# Altium footprint library Connector-Header.PcbLib: 166 footprints (part 1 of 11)
Each footprint in its own frame and in the unit in brackets; x right, y up, seen from the top. Pads: shape width x height; smd on the part's side, far side on the other; paste and mask are expansions set on the pad; w line width, h text height; cw(c..) or ccw(c..) is an arc to the next point about the centre after c.
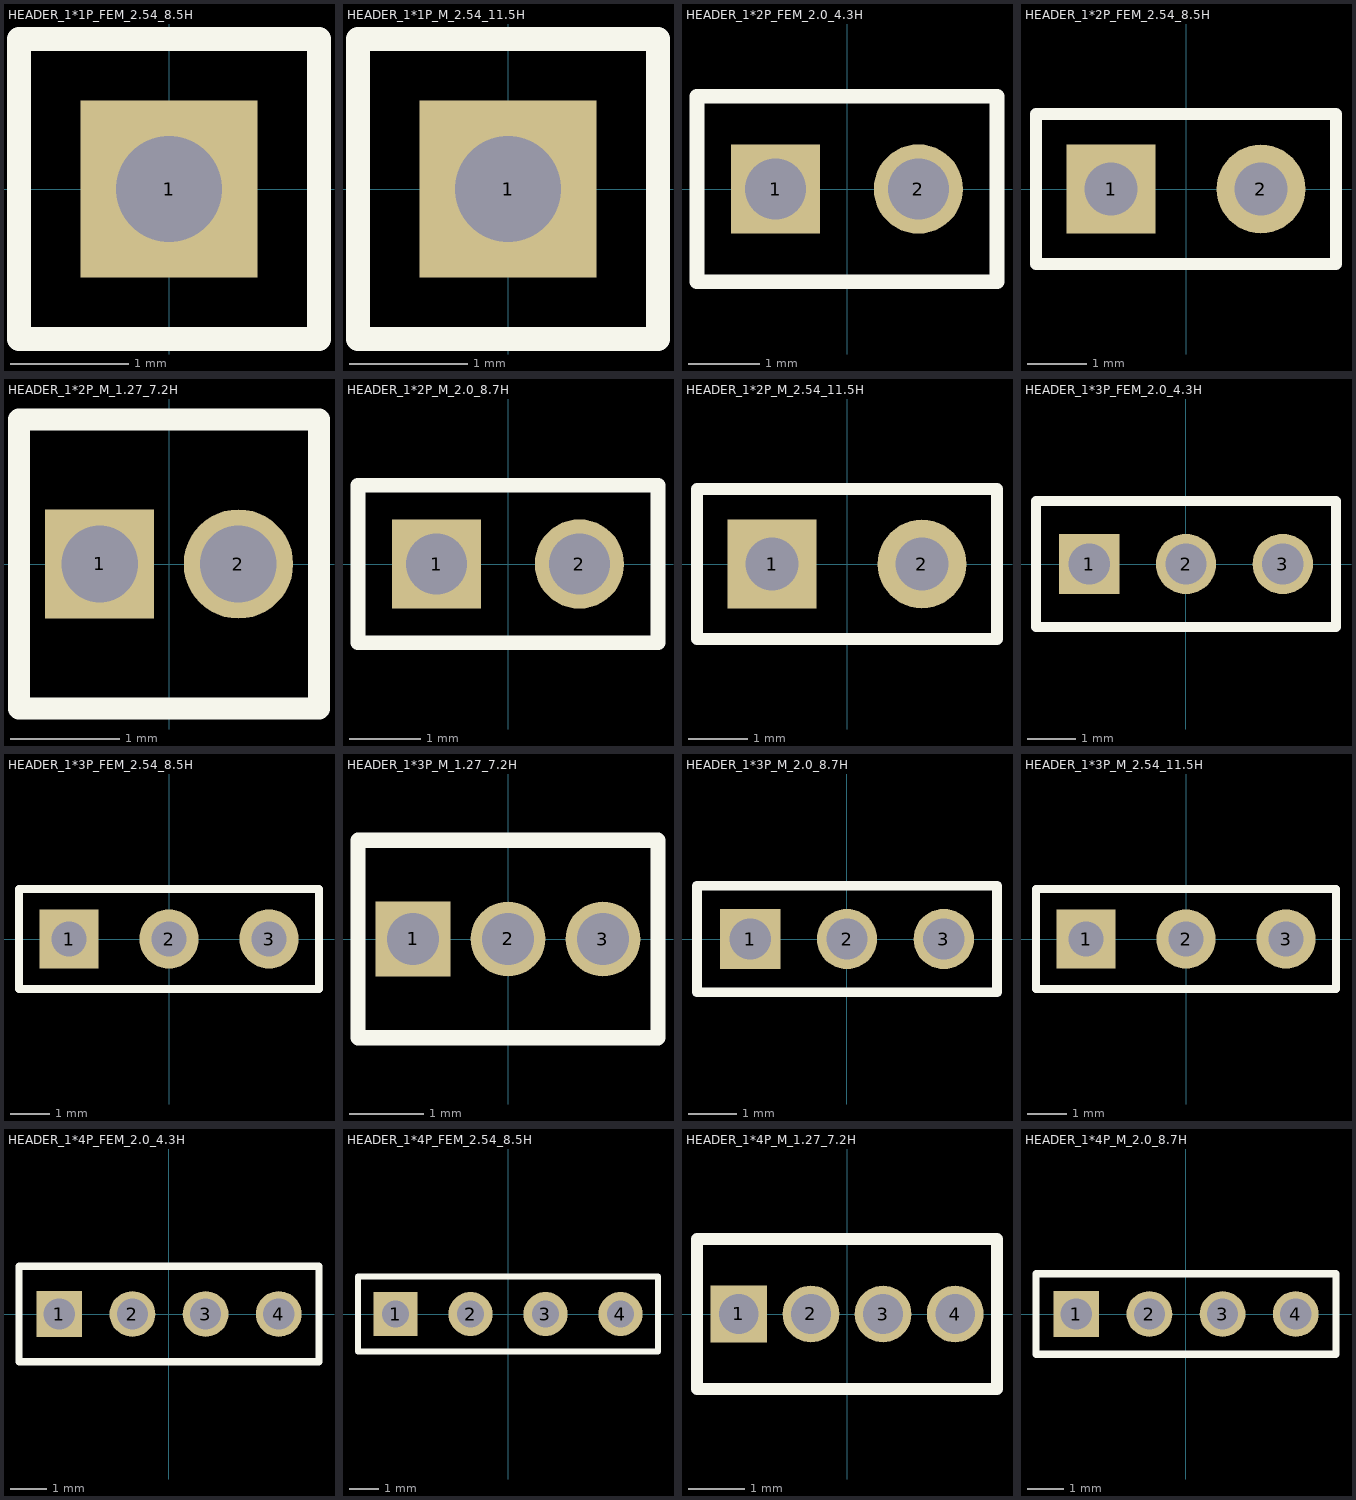
[diagram p0: the footprints below, top view; thin cyan lines are the x and y axes]

## HEADER_1*1P_FEM_2.54_8.5H [mm] "Connector; Header; 1 Position"
pads (1):
  rect 1.5x1.5 hole 0.9: 1(0,0)
Top Overlay:
  lines w0.2: -1.27,-1.27 -1.27,1.27 ; 1.27,-1.27 1.27,1.27
  lines w0.203: -1.27,-1.27 1.27,-1.27 ; -1.27,1.27 1.27,1.27
3D body "PinSocket_1x01_P2.54mm_Vertical.step": height 7, standoff -3.1, extent -1.27,-1.27 1.27,1.27

## HEADER_1*1P_M_2.54_11.5H [mm] "Connector; Header; 1 Position"
pads (1):
  rect 1.5x1.5 hole 0.9: 1(0,0)
Top Overlay:
  lines w0.2: -1.27,-1.27 -1.27,1.27 1.27,1.27 1.27,-1.27 -1.27,-1.27
3D body "PinHeader_1x01_P2.54mm_Vertical.step": height 8.54, standoff -3, extent -1.27,-1.27 1.27,1.27

## HEADER_1*2P_FEM_2.0_4.3H [mm]
pads (2):
  rect 1.25x1.25 hole 0.85: 1(-1,0)
  round 1.25 hole 0.85: 2(1,0)
Top Overlay:
  lines w0.203: -2.1,-1.3 2.1,-1.3 2.1,1.3 -2.1,1.3 -2.1,-1.3
3D body "PinSocket_1x02_P2.00mm_Vertical.step": height 5.6, standoff -2.7, extent -2,-1 2,1

## HEADER_1*2P_FEM_2.54_8.5H [mm] "Connector; Header; 2 Position"
pads (2):
  rect 1.5x1.5 hole 0.9: 1(-1.27,0)
  round 1.5 hole 0.9: 2(1.27,0)
Top Overlay:
  lines w0.2: -2.54,-1.27 -2.54,1.27 2.54,1.27 2.54,-1.27 -2.54,-1.27
3D body "PinSocket_1x02_P2.54mm_Vertical.step": height 7, standoff -3.1, extent -2.54,-1.27 2.54,1.27

## HEADER_1*2P_M_1.27_7.2H [mm]
pads (2):
  rect 1x1 hole 0.7: 1(-0.635,0)
  round 1 hole 0.7: 2(0.635,0)
Top Overlay:
  lines w0.203: -1.372,-1.321 -1.372,1.321 1.372,1.321 1.372,-1.321 -1.372,-1.321
3D body "PinHeader_1x02_P1.27mm_Vertical.step": height 4, standoff -2.3, extent -1.27,-1.05 1.27,1.05

## HEADER_1*2P_M_2.0_8.7H [mm]
pads (2):
  rect 1.25x1.25 hole 0.85: 1(-1,0)
  round 1.25 hole 0.85: 2(1,0)
Top Overlay:
  lines w0.203: -2.1,-1.1 2.1,-1.1 2.1,1.1 -2.1,1.1 -2.1,-1.1

## HEADER_1*2P_M_2.54_11.5H [mm] "Connector; Header; 2 Position"
pads (2):
  rect 1.5x1.5 hole 0.9: 1(-1.27,0)
  round 1.5 hole 0.9: 2(1.27,0)
Top Overlay:
  lines w0.2: -2.54,-1.27 -2.54,1.27 2.54,1.27 2.54,-1.27 -2.54,-1.27
3D body "PinHeader_1x02_P2.54mm_Vertical.step": height 8.54, standoff -3, extent -2.54,-1.27 2.54,1.27

## HEADER_1*3P_FEM_2.0_4.3H [mm]
pads (3):
  rect 1.25x1.25 hole 0.85: 1(-2,0)
  round 1.25 hole 0.85: 2(0,0) 3(2,0)
Top Overlay:
  lines w0.203: -3.1,-1.3 -3.1,1.3 3.1,1.3 3.1,-1.3 -3.1,-1.3

## HEADER_1*3P_FEM_2.54_8.5H [mm] "Connector; Header; 3 Position"
pads (3):
  rect 1.5x1.5 hole 0.9: 1(-2.54,0)
  round 1.5 hole 0.9: 2(0,0) 3(2.54,0)
Top Overlay:
  lines w0.2: -3.81,-1.27 3.81,-1.27 3.81,1.27 -3.81,1.27 -3.81,-1.27
3D body "PinSocket_1x03_P2.54mm_Vertical.step": height 7, standoff -3.1, extent -3.81,-1.27 3.81,1.27

## HEADER_1*3P_M_1.27_7.2H [mm]
pads (3):
  rect 1x1 hole 0.7: 1(-1.27,0)
  round 1 hole 0.7: 2(0,0) 3(1.27,0)
Top Overlay:
  lines w0.203: -2.007,-1.321 2.007,-1.321 2.007,1.321 -2.007,1.321 -2.007,-1.321

## HEADER_1*3P_M_2.0_8.7H [mm]
pads (3):
  rect 1.25x1.25 hole 0.85: 1(-2,0)
  round 1.25 hole 0.85: 2(0,0) 3(2,0)
Top Overlay:
  lines w0.203: -3.1,-1.1 3.1,-1.1 3.1,1.1 -3.1,1.1 -3.1,-1.1

## HEADER_1*3P_M_2.54_11.5H [mm] "Connector; Header; 3 Position"
pads (3):
  rect 1.5x1.5 hole 0.9: 1(-2.54,0)
  round 1.5 hole 0.9: 2(0,0) 3(2.54,0)
Top Overlay:
  lines w0.2: -3.81,-1.27 -3.81,1.27 3.81,1.27 3.81,-1.27 -3.81,-1.27
3D body "PinHeader_1x03_P2.54mm_Vertical.step": height 8.54, standoff -3, extent -3.81,-1.27 3.81,1.27

## HEADER_1*4P_FEM_2.0_4.3H [mm]
pads (4):
  rect 1.25x1.25 hole 0.85: 1(-3,0)
  round 1.25 hole 0.85: 2(-1,0) 3(1,0) 4(3,0)
Top Overlay:
  lines w0.203: -4.1,-1.3 -4.1,1.3 4.1,1.3 4.1,-1.3 -4.1,-1.3

## HEADER_1*4P_FEM_2.54_8.5H [mm]
pads (4):
  rect 1.5x1.5 hole 0.9: 1(-3.81,0)
  round 1.5 hole 0.9: 2(-1.27,0) 3(1.27,0) 4(3.81,0)
Top Overlay:
  lines w0.2: -5.08,-1.27 -5.08,1.27 5.08,1.27 5.08,-1.27 -5.08,-1.27
3D body "PinSocket_1x04_P2.54mm_Vertical.step": height 7, standoff -3.1, extent -5.08,-1.27 5.08,1.27

## HEADER_1*4P_M_1.27_7.2H [mm]
pads (4):
  rect 1x1 hole 0.7: 1(-1.905,0)
  round 1 hole 0.7: 2(-0.635,0) 3(0.635,0) 4(1.905,0)
Top Overlay:
  lines w0.203: -2.642,-1.321 2.642,-1.321 2.642,1.321 -2.642,1.321 -2.642,-1.321
3D body "pin_header_a-sl127-eg-g04d.stp": height 5.34, standoff -2.6, extent -2.54,-1.25 2.54,1.25

## HEADER_1*4P_M_2.0_8.7H [mm]
pads (4):
  rect 1.25x1.25 hole 0.85: 1(-3,0)
  round 1.25 hole 0.85: 2(-1,0) 3(1,0) 4(3,0)
Top Overlay:
  lines w0.203: -4.1,-1.1 4.1,-1.1 4.1,1.1 -4.1,1.1 -4.1,-1.1